# Altium footprint library mainLib.PcbLib: 169 footprints (part 7 of 11)
Each footprint in its own frame and in the unit in brackets; x right, y up, seen from the top. Pads: shape width x height; smd on the part's side, far side on the other; paste and mask are expansions set on the pad; w line width, h text height; cw(c..) or ccw(c..) is an arc to the next point about the centre after c.
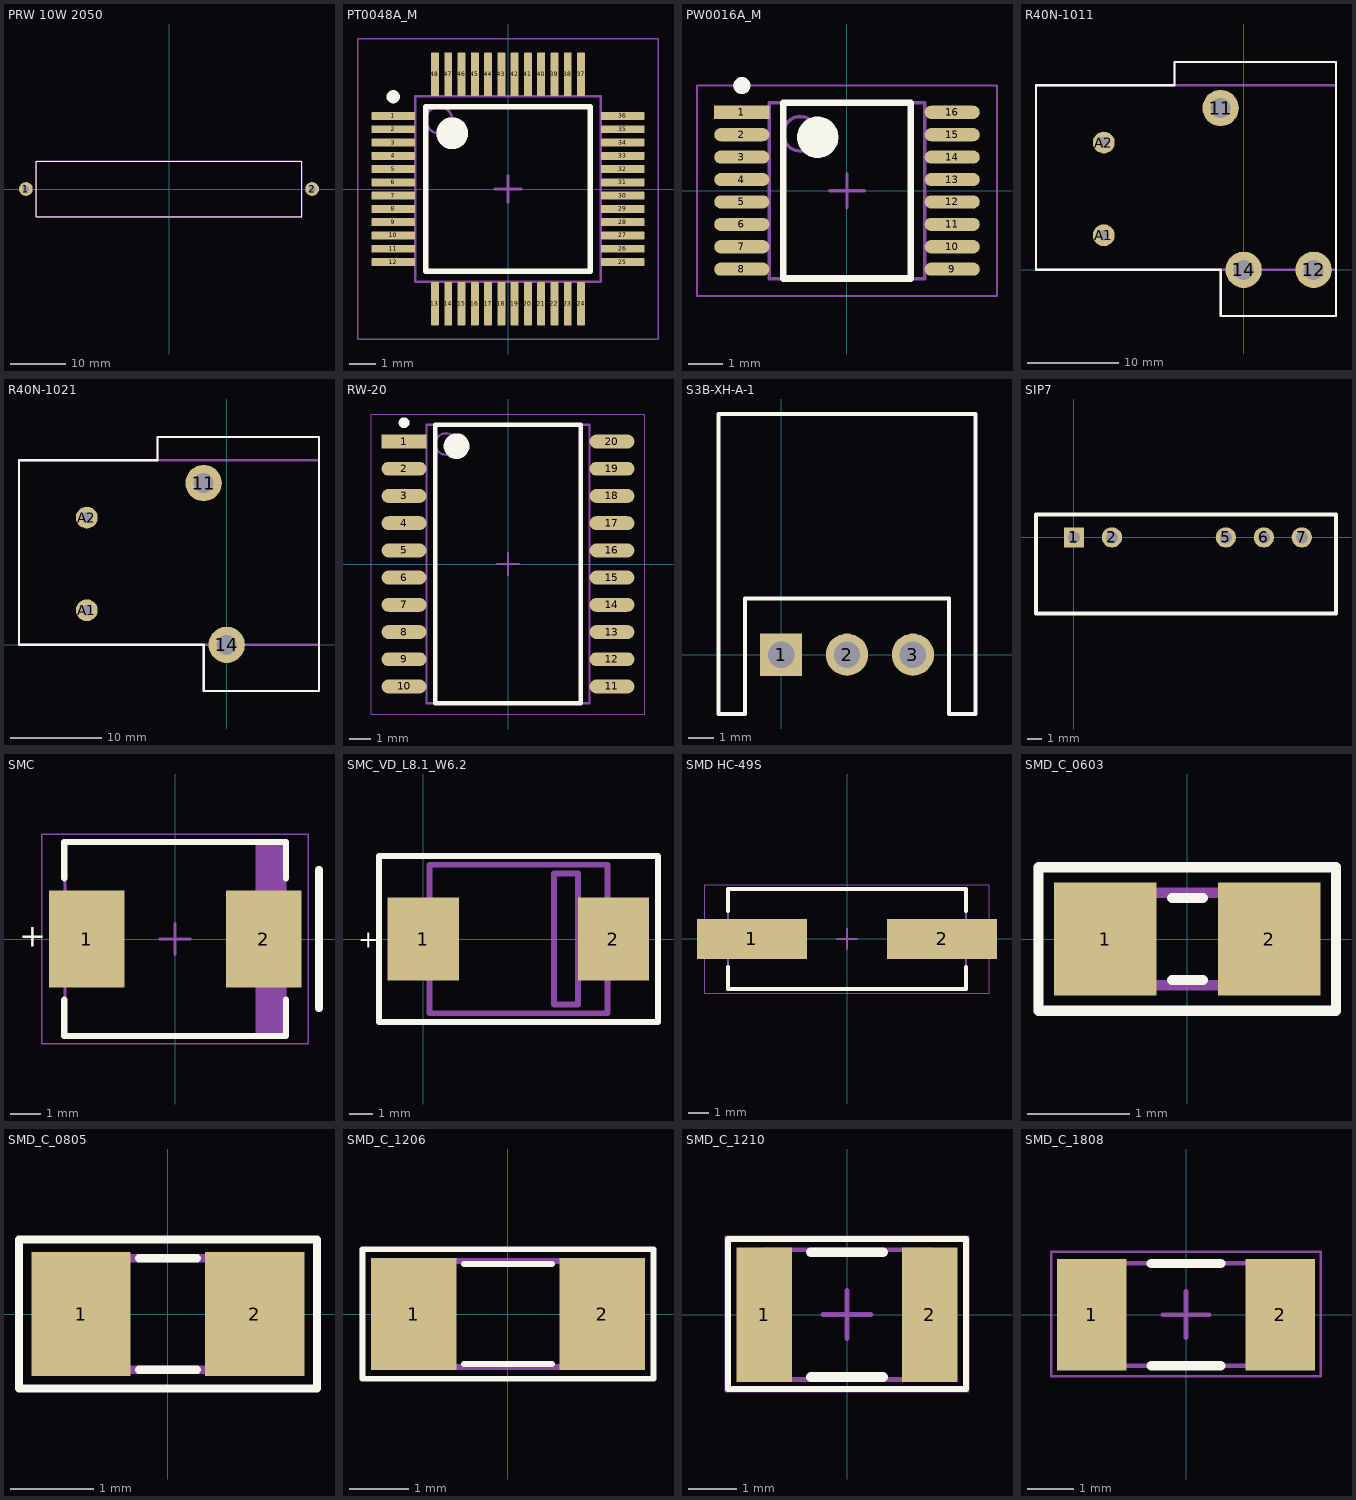
[diagram p6: the footprints below, top view; thin cyan lines are the x and y axes]

## PRW 10W 2050 [mm]
pads (2):
  round 2.5 hole 1.2: 1(-26,0) 2(26,0)
Top Overlay:
  lines w0.127: -24.13,-5 24.13,-5 24.13,5 -24.13,5 -24.13,-5
Mechanical 13:
  lines w0.254: -24.125,-5 -24.125,5 24.125,5 24.125,-5 -24.125,-5
3D body: height 9, standoff 0, extent -24.124,-4.999 24.124,4.999

## PT0048A_M [mm] "QFP, 48-Leads, Body 7x7mm, Pitch 0.5mm, IPC Low Density"
height 1.6
pads (48):
  rrect33% 1.65x0.3 smd: 1(-4.325,2.75) 2(-4.325,2.25) 3(-4.325,1.75) 4(-4.325,1.25) 5(-4.325,0.75) 6(-4.325,0.25) 7(-4.325,-0.25) 8(-4.325,-0.75) 9(-4.325,-1.25) 10(-4.325,-1.75) 11(-4.325,-2.25) 12(-4.325,-2.75) 25(4.325,-2.75) 26(4.325,-2.25) 27(4.325,-1.75) 28(4.325,-1.25) 29(4.325,-0.75) 30(4.325,-0.25) 31(4.325,0.25) 32(4.325,0.75) 33(4.325,1.25) 34(4.325,1.75) 35(4.325,2.25) 36(4.325,2.75)
  rrect33% 0.3x1.65 smd: 13(-2.75,-4.325) 14(-2.25,-4.325) 15(-1.75,-4.325) 16(-1.25,-4.325) 17(-0.75,-4.325) 18(-0.25,-4.325) 19(0.25,-4.325) 20(0.75,-4.325) 21(1.25,-4.325) 22(1.75,-4.325) 23(2.25,-4.325) 24(2.75,-4.325) 37(2.75,4.325) 38(2.25,4.325) 39(1.75,4.325) 40(1.25,4.325) 41(0.75,4.325) 42(0.25,4.325) 43(-0.25,4.325) 44(-0.75,4.325) 45(-1.25,4.325) 46(-1.75,4.325) 47(-2.25,4.325) 48(-2.75,4.325)
Top Overlay:
  circle w0.25: c-4.325,3.475 r0.125
  circle w0.6: c-2.1,2.1 r0.3
  lines w0.2: -3.1,-3.1 -3.1,3.1 3.1,3.1 3.1,-3.1 -3.1,-3.1
Mechanical 1:
  text ".Designator" at -1.524,-0.508 h1.02
Mechanical 13:
  circle w0.1: c-2.6,2.6 r0.5
  lines w0.1: -3.5,-3.5 -3.5,3.5 3.5,3.5 3.5,-3.5 -3.5,-3.5
Mechanical 15:
  lines w0.05: -5.65,-5.65 -5.65,5.65 5.65,5.65 5.65,-5.65 -5.65,-5.65
  lines w0.1: -0.5,0 0.5,0 ; 0,-0.5 0,0.5
3D body "PT0048A.stp": height 1.5, standoff 0, extent -4.508,-4.508 4.508,4.508

## PW0016A_M [mm] "SOP, 16-Leads, Body 5.1x4.5mm, Pitch 0.65mm, IPC Low Density"
height 1.2
pads (16):
  rect 1.6x0.381 smd: 1(-3.05,2.275)
  oval 1.6x0.381 smd: 2(-3.05,1.625) 3(-3.05,0.975) 4(-3.05,0.325) 5(-3.05,-0.325) 6(-3.05,-0.975) 7(-3.05,-1.625) 8(-3.05,-2.275) 9(3.05,-2.275) 10(3.05,-1.625) 11(3.05,-0.975) 12(3.05,-0.325) 13(3.05,0.325) 14(3.05,0.975) 15(3.05,1.625) 16(3.05,2.275)
Top Overlay:
  circle w0.25: c-3.05,3.05 r0.125
  circle w0.6: c-0.85,1.55 r0.3
  lines w0.2: -1.85,-2.55 -1.85,2.55 1.85,2.55 1.85,-2.55 -1.85,-2.55
Mechanical 13:
  circle w0.1: c-1.35,1.65 r0.5
  lines w0.1: -2.25,-2.55 -2.25,2.55 2.25,2.55 2.25,-2.55 -2.25,-2.55
Mechanical 15:
  lines w0.05: -4.35,-3.05 -4.35,3.05 4.35,3.05 4.35,-3.05 -4.35,-3.05
  lines w0.1: -0.5,0 0.5,0 ; 0,-0.5 0,0.5
3D body "PW0016AakaMTC16.stp": height 1.2, standoff 0, extent -3.21,-2.5 3.21,2.5

## R40N-1011 [mm]
pads (5):
  round 4 hole 2.2: 11(-2.54,17.8) 12(7.7,0) 14(0,0)
  round 2.4 hole 1.2: A1(-15.4,3.8) A2(-15.4,14)
Top Overlay:
  lines w0.254: -22.86,0 -22.86,20.32 -7.62,20.32 -7.62,22.86 10.16,22.86 10.16,-5.08 -2.54,-5.08 -2.54,0 -22.86,0
Mechanical 13:
  lines w0.254: -2.54,0 -2.54,-5.08 10.16,-5.08 10.16,0 ; 10.16,0 10.16,20.32 ; 10.16,0 -22.86,0 -22.86,20.32 10.16,20.32 ; 10.16,20.32 -7.62,20.32 -7.62,22.86 10.16,22.86 10.16,20.32
3D body: height 20.5, standoff 0, extent -2.539,-5.079 10.159,-0.001
3D body: height 20.5, standoff 0, extent -7.619,20.321 10.159,22.859
3D body: height 20.5, standoff 0, extent -22.859,0.001 10.159,20.319

## R40N-1021 [mm]
pads (4):
  round 4 hole 2.2: 11(-2.54,17.8) 14(0,0)
  round 2.4 hole 1.2: A1(-15.4,3.8) A2(-15.4,14)
Top Overlay:
  lines w0.254: -22.86,0 -2.54,0 -2.54,-5.08 10.16,-5.08 10.16,22.86 -7.62,22.86 -7.62,20.32 -22.86,20.32 -22.86,0
Mechanical 13:
  lines w0.254: -2.54,0 -2.54,-5.08 10.16,-5.08 10.16,0 ; 10.16,0 -22.86,0 -22.86,20.32 10.16,20.32 ; 10.16,0 10.16,20.32 ; 10.16,20.32 10.16,22.86 -7.62,22.86 -7.62,20.32 10.16,20.32
3D body: height 20.5, standoff 0, extent -22.859,0.001 10.159,20.319
3D body: height 20.5, standoff 0, extent -7.619,20.321 10.159,22.859
3D body: height 20.5, standoff 0, extent -2.539,-5.079 10.159,-0.001

## RW-20 [mm] "SOIC, 20-Leads, Body 12,80x7,50mm, Pitch 1,27mm, IPC Low Density"
height 2.65
pads (20):
  rect 2.1x0.65 smd: 1(-4.85,5.715)
  oval 2.1x0.65 smd: 2(-4.85,4.445) 3(-4.85,3.175) 4(-4.85,1.905) 5(-4.85,0.635) 6(-4.85,-0.635) 7(-4.85,-1.905) 8(-4.85,-3.175) 9(-4.85,-4.445) 10(-4.85,-5.715) 11(4.85,-5.715) 12(4.85,-4.445) 13(4.85,-3.175) 14(4.85,-1.905) 15(4.85,-0.635) 16(4.85,0.635) 17(4.85,1.905) 18(4.85,3.175) 19(4.85,4.445) 20(4.85,5.715)
Top Overlay:
  circle w0.25: c-4.85,6.59 r0.125
  circle w0.6: c-2.4,5.5 r0.3
  lines w0.2: -3.4,-6.5 -3.4,6.5 3.4,6.5 3.4,-6.5 -3.4,-6.5
Mechanical 13:
  circle w0.1: c-2.9,5.6 r0.5
  lines w0.1: -3.8,-6.5 -3.8,6.5 3.8,6.5 3.8,-6.5 -3.8,-6.5
Mechanical 15:
  lines w0.05: -6.375,-7 -6.375,7 6.375,7 6.375,-7 -6.375,-7
  lines w0.1: -0.5,0 0.5,0 ; 0,-0.5 0,0.5
3D body "SOIC127P1030X265-20M.step": height 2.65, standoff 0, extent -5.162,-6.5 5.162,6.5

## S3B-XH-A-1 [mil]
pads (3):
  rect 64x64 / inner round 0 / far side rect 64x64 hole 40 mask+5: 1(0,0)
  round 64 / inner round 0 / far side round 64 hole 40 mask+5: 2(100,0) 3(200,0)
Top Overlay:
  lines w6: -95,-90 -95,365 295,365 295,-90 255,-90 255,85 -55,85 -55,-90 -95,-90
3D body "S3B-XH-A.STEP": height 243.13, standoff -132.86, extent -94.88,-90.38 294.88,362.38

## SIP7 [mm]
pads (5):
  rect 1.36x1.36 hole 0.8 mask+0.102: 1(0,0)
  round 1.36 hole 0.8 mask+0.102: 2(2.54,0) 5(10.16,0) 6(12.7,0) 7(15.24,0)
Top Overlay:
  lines w0.254: -2.54,-5.08 16.002,-5.08 17.526,-5.08 17.526,1.524 -2.54,1.524 -2.54,-5.08
3D body: height 10.16, standoff 0, extent -2.539,-5.079 17.525,1.523

## SMC [mm] "Molded Diode, 2-Leads, Body 6,88x5,90mm, IPC Medium Density"
height 2.45
pads (2):
  rect 2.45x3.15 smd: 1(-2.875,0) 2(2.875,0)
Top Overlay:
  lines w0.2: -3.6,-1.975 -3.6,-3.15 3.6,-3.15 3.6,-1.975 ; -3.6,1.975 -3.6,3.15 3.6,3.15 3.6,1.975
  lines w0.254: 4.675,-2.25 4.675,2.25
  text "+" at -5.069,-0.256 h0.76
Mechanical 13:
  rectangle: 2.613,-3.125 3.575,3.125
  lines w0.1: -3.575,-3.125 -3.575,3.125 3.575,3.125 3.575,-3.125 -3.575,-3.125
Mechanical 15:
  lines w0.05: -4.325,-3.4 -4.325,3.4 4.325,3.4 4.325,-3.4 -4.325,-3.4
  lines w0.1: -0.5,0 0.5,0 ; 0,-0.5 0,0.5
3D body "DIOM6959X25N.step": height 2.45, standoff 0, extent -3.795,-3.125 3.795,3.125

## SMC_VD_L8.1_W6.2 [mil] "Schottky Diode, 2-Leads, Body 8,13x6,52mm, IPC Low Density"
pads (2):
  rect 120x140 smd: 1(0,0) 2(320,0)
Top Overlay:
  lines w10: -75,-140 395,-140 395,140 -75,140 -75,0 -75,-140
  text "+" at -110,-15 h30
Mechanical 13:
  lines w10: 0,-60 0,0 0,60 10,60 10,20 10,-20 10,-60 0,-60 ; 10,-125 280,-125 310,-125 310,125 280,125 10,125 10,10 10,-41.25 10,-83.75 10,-125 ; 220,-110 220,110 260,110 260,-110 220,-110 ; 310,-60 320,-60 320,60 310,60 310,-10 310,-60
3D body: height 50, standoff 0, extent 0.02,-59.98 9.98,59.98
3D body: height 50, standoff 0, extent 310.02,-59.98 319.98,59.98
3D body: height 107, standoff 105, extent 220.02,-109.98 259.98,109.98
3D body: height 105, standoff 0, extent 10.02,-124.98 309.98,124.98

## SMD HC-49S [mm] "SODFL, 2-Leads, Body 4,80x12,70mm, IPC Low Density"
height 4.1
pads (2):
  rect 5.5x2 smd: 1(-4.75,0) 2(4.75,0)
Top Overlay:
  lines w0.2: -5.95,-1.4 -5.95,-2.5 5.95,-2.5 5.95,-1.4 ; -5.95,1.4 -5.95,2.5 5.95,2.5 5.95,1.4
Mechanical 13:
  lines w0.1: -5.95,-2.5 -5.95,2.5 5.95,2.5 5.95,-2.5 -5.95,-2.5
Mechanical 15:
  lines w0.05: -7.1,-2.7 -7.1,2.7 7.1,2.7 7.1,-2.7 -7.1,-2.7
  lines w0.1: -0.5,0 0.5,0 ; 0,-0.5 0,0.5
3D body "SMD HC-49S.step": height 4.1, standoff 0, extent -6.35,-2.5 6.35,2.5

## SMD_C_0603 [mm]
height 0.7
pads (2):
  rect 1x1.1 smd: 1(-0.8,0) 2(0.8,0)
Top Overlay:
  lines w0.1: -0.15,-0.4 0.15,-0.4 ; -0.15,0.4 0.15,0.4 ; -1.45,-0.7 -1.45,0.7 1.45,0.7 1.45,-0.7 -1.45,-0.7
Mechanical 13:
  lines w0.1: -0.9,-0.45 -0.9,0.45 0.9,0.45 0.9,-0.45 -0.9,-0.45
Mechanical 15:
  lines w0.05: -1.475,-0.7 -1.475,0.7 1.45,0.7 1.45,-0.7 -1.475,-0.7
3D body "SMD_C_0603_2.step": height 0.7, standoff 0, extent -0.9,-0.45 0.9,0.45

## SMD_C_0805 [mm]
height 0.7
pads (2):
  rect 1.2x1.5 smd: 1(-1.05,0) 2(1.05,0)
Top Overlay:
  lines w0.1: -0.35,-0.675 0.35,-0.675 ; -0.35,0.675 0.35,0.675 ; -1.8,-0.9 1.8,-0.9 1.8,0.9 -1.8,0.9 -1.8,-0.9
Mechanical 13:
  lines w0.1: -1.05,-0.675 -1.05,0.675 1.05,0.675 1.05,-0.675 -1.05,-0.675
Mechanical 15:
  lines w0.05: -1.8,-0.9 -1.8,0.9 1.825,0.9 1.825,-0.9 -1.8,-0.9
3D body "SMD_C_0805_3.step": height 0.7, standoff 0, extent -1.05,-0.675 1.05,0.675

## SMD_C_1206 [mm]
height 1.6
pads (2):
  rect 1.45x1.9 smd: 1(-1.6,0) 2(1.6,0)
Top Overlay:
  lines w0.1: -0.75,-0.85 0.75,-0.85 ; -0.75,0.85 0.75,0.85 ; -2.475,-1.1 2.475,-1.1 2.475,1.1 -2.475,1.1 -2.475,-1.1
Mechanical 13:
  lines w0.1: -1.7,-0.9 1.7,-0.9 1.7,0.9 -1.7,0.9 -1.7,-0.9
Mechanical 15:
  lines w0.05: -2.5,-1.1 2.475,-1.1 2.475,1.1 -2.5,1.1 -2.5,-1.1
3D body "SMD_C_1206.step": height 1.6, standoff 0, extent -1.7,-0.9 1.7,0.9

## SMD_C_1210 [mm] "Chip Capacitor, 2-Leads, Body 3,20x2,50mm, IPC Low Density"
height 2.5
pads (2):
  rect 1.15x2.8 smd: 1(-1.725,0) 2(1.725,0)
Top Overlay:
  lines w0.127: -2.475,-1.55 -2.475,1.575 2.475,1.575 2.475,-1.55 -2.475,-1.55
  lines w0.2: -0.75,-1.3 0.75,-1.3 ; -0.75,1.3 0.75,1.3
Mechanical 13:
  lines w0.1: -1.75,-1.35 -1.75,1.35 1.75,1.35 1.75,-1.35 -1.75,-1.35
Mechanical 15:
  lines w0.05: -2.525,-1.6 -2.525,1.625 2.525,1.625 2.525,-1.6 -2.525,-1.6
  lines w0.1: -0.5,0 0.5,0 ; 0,-0.5 0,0.5
3D body "CAPC3225X25M.step": height 2.5, standoff 0, extent -1.75,-1.35 1.75,1.35

## SMD_C_1808 [mm] "Chip Capacitor, 2-Leads, Body 4,60x2,00mm, IPC Medium Density"
height 2.2
pads (2):
  rect 1.5x2.4 smd: 1(-2.025,0) 2(2.025,0)
Top Overlay:
  lines w0.2: -0.75,-1.1 0.75,-1.1 ; -0.75,1.1 0.75,1.1
Mechanical 13:
  lines w0.1: -2.55,-1.1 2.55,-1.1 2.55,1.1 -2.55,1.1 -2.55,-1.1
Mechanical 15:
  lines w0.05: -2.9,-1.325 2.9,-1.325 2.9,1.35 -2.9,1.35 -2.9,-1.325
  lines w0.1: -0.5,0 0.5,0 ; 0,-0.5 0,0.5
3D body "SMD_C_1808.step": height 2.2, standoff 0, extent -2.55,-1.1 2.55,1.1